# Altium footprint library Miscellaneous Base.PcbLib: 153 footprints (part 2 of 10)
Each footprint in its own frame and in the unit in brackets; x right, y up, seen from the top. Pads: shape width x height; smd on the part's side, far side on the other; paste and mask are expansions set on the pad; w line width, h text height; cw(c..) or ccw(c..) is an arc to the next point about the centre after c.
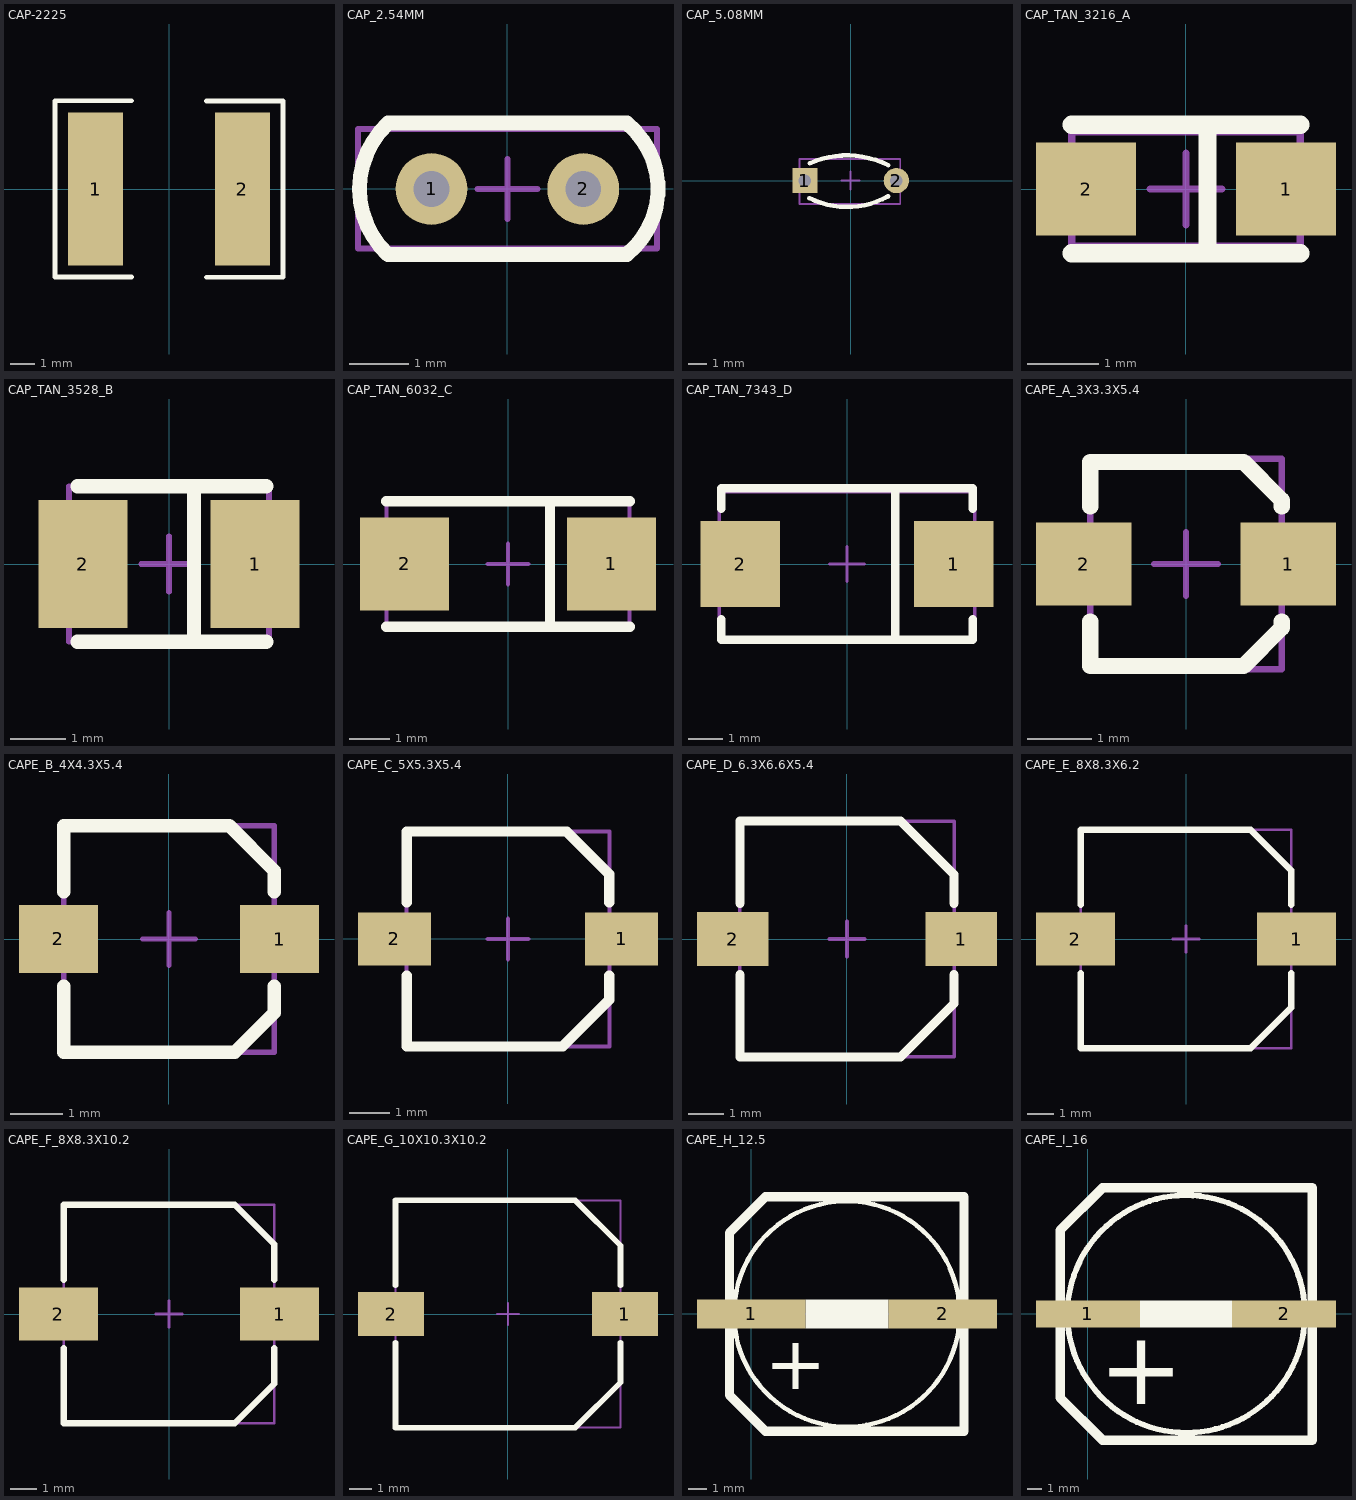
[diagram p1: the footprints below, top view; thin cyan lines are the x and y axes]

## CAP-2225 [mil]
pads (2):
  rect 90x250 smd: 1(-120,0) 2(120,0)
Top Overlay:
  lines w7.87: -61,-143.99 -186,-143.99 -186,144.01 -61,144.01 ; 61,-144 186,-144 186,144 61,144
3D body "2225C.STEP": height 70.87, standoff 0, extent -112.2,-124.99 112.21,125.01

## CAP_2.54MM [mm]
pads (2):
  round 1.2 hole 0.6: 1(-1.27,0) 2(1.27,0)
Top Overlay:
  lines w0.25: -2,1.097 ccw(c-0.972,-0.002) -2,-1.1 2,-1.1 ; -2,1.1 2,1.1 ; 1.999,-1.099 ccw(c1.1,0) 1.999,1.099
Mechanical 15:
  lines w0.1: -0.5,0 0.5,0 ; 0,-0.5 0,0.5 ; -2.5,-1 2.5,-1 2.5,1 -2.5,1 -2.5,-1
3D body "CAP TR2.54.STEP": height 5.92, standoff -2, extent -2.919,-0.836 2.919,0.86

## CAP_5.08MM [mm]
pads (2):
  rect 1.4x1.4 hole 0.7: 1(-2.54,0)
  round 1.4 hole 0.7: 2(2.54,0)
Top Overlay:
  lines w0.254: -2.286,-0.972 ccw(c-0.2,3.2) 2.082,-0.868 ; -2.28,0.955 cw(c-0.2,-3.7) 2.08,0.861
Mechanical 15:
  lines w0.1: -0.5,0 0.5,0 ; 0,-0.5 0,0.5 ; -2.84,-1.3 -2.84,1.2 2.76,1.2 2.76,-1.3 -2.84,-1.3
3D body "CAP ceramic F=5mm.STEP": height 6, standoff -3, extent -2.84,-1.3 2.76,1.2

## CAP_TAN_3216_A [mm]
pads (2):
  rect 1.4x1.3 smd: 1(1.4,0) 2(-1.4,0)
Top Overlay:
  lines w0.254: -1.6,-0.9 1.6,-0.9 ; -1.6,0.9 1.6,0.9 ; 0.3,-0.9 0.3,0.9
Mechanical 15:
  lines w0.1: -0.5,0 0.5,0 ; 0,-0.5 0,0.5 ; -1.6,-0.8 -1.6,0.8 1.6,0.8 1.6,-0.8 -1.6,-0.8
3D body "CAP-A.STEP": height 1.6, standoff 0, extent -1.6,-0.8 1.6,0.8

## CAP_TAN_3528_B [mm]
pads (2):
  rect 1.6x2.3 smd: 1(1.55,0) 2(-1.55,0)
Top Overlay:
  lines w0.254: -1.65,-1.4 1.75,-1.4 ; -1.65,1.4 1.75,1.4 ; 0.45,-1.4 0.45,1.4
Mechanical 15:
  lines w0.1: -0.5,0 0.5,0 ; 0,-0.5 0,0.5 ; -1.8,-1.4 1.8,-1.4 1.8,1.4 -1.8,1.4 -1.8,-1.4
3D body "CAP-B.STEP": height 1.9, standoff 0, extent -1.75,-1.4 1.75,1.4

## CAP_TAN_6032_C [mm]
pads (2):
  rect 2.2x2.3 smd: 1(2.55,0) 2(-2.55,0)
Top Overlay:
  lines w0.254: -3,-1.55 3,-1.55 ; -3,1.55 3,1.55 ; 1.036,-1.55 1.036,1.55
Mechanical 15:
  lines w0.1: -0.5,0 0.5,0 ; 0,-0.5 0,0.5 ; -3,-1.6 -3,1.6 3,1.6 3,-1.6 -3,-1.6
3D body "CAP-C.STEP": height 2.5, standoff 0, extent -3,-1.6 3,1.6

## CAP_TAN_7343_D [mm]
pads (2):
  rect 2.3x2.5 smd: 1(3.1,0) 2(-3.1,0)
Top Overlay:
  lines w0.254: -3.65,-1.6 -3.65,-2.2 3.65,-2.2 3.65,-1.6 ; -3.65,1.6 -3.65,2.2 3.65,2.2 3.65,1.6 ; 1.4,-2.2 1.4,2.2
Mechanical 15:
  lines w0.1: -0.5,0 0.5,0 ; 0,-0.5 0,0.5 ; -3.7,-2.2 -3.7,2.1 3.7,2.1 3.7,-2.2 -3.7,-2.2
3D body "CAP-D.STEP": height 2.8, standoff 0, extent -3.65,-2.2 3.65,2.1

## CAPE_A_3X3.3X5.4 [mm]
pads (2):
  rect 1.5x1.3 smd: 1(1.6,0) 2(-1.6,0)
Top Overlay:
  lines w0.254: -1.5,-0.9 -1.5,-1.6 0.9,-1.6 1.5,-1 1.5,-0.9 ; -1.5,0.9 -1.5,1.6 0.9,1.6 1.5,1 1.5,0.9
Mechanical 15:
  lines w0.1: -0.5,0 0.5,0 ; 0,-0.5 0,0.5 ; -1.5,-1.65 1.5,-1.65 1.5,1.65 -1.5,1.65 -1.5,-1.65
3D body "CAPE-A.STEP": height 5.4, standoff 0, extent -1.8,-1.65 1.8,1.65

## CAPE_B_4X4.3X5.4 [mm]
pads (2):
  rect 1.5x1.3 smd: 1(2.1,0) 2(-2.1,0)
Top Overlay:
  lines w0.254: -2,-0.9 -2,-2.15 1.25,-2.15 2,-1.4 2,-0.9 ; -2,0.9 -2,2.15 1.15,2.15 2,1.3 2,0.9
Mechanical 15:
  lines w0.1: -0.5,0 0.5,0 ; 0,-0.5 0,0.5 ; 2,-2.15 -2,-2.15 -2,2.15 2,2.15 2,-2.115
3D body "CAPE-B.STEP": height 5.4, standoff 0, extent -2.3,-2.175 2.3,2.125

## CAPE_C_5X5.3X5.4 [mm]
pads (2):
  rect 1.8x1.3 smd: 1(2.8,0) 2(-2.8,0)
Top Overlay:
  lines w0.254: -2.5,-0.9 -2.5,-2.65 1.35,-2.65 2.5,-1.5 2.5,-0.9 ; -2.5,0.9 -2.5,2.65 1.45,2.65 2.5,1.6 2.5,0.9
Mechanical 15:
  lines w0.1: -0.5,0 0.5,0 ; 0,-0.5 0,0.5 ; -2.5,-2.65 -2.5,2.65 2.5,2.65 2.5,-2.65 -2.5,-2.65
3D body "CAPE-C.STEP": height 5.41, standoff 0, extent -2.95,-2.6 2.95,2.7

## CAPE_D_6.3X6.6X5.4 [mm]
pads (2):
  rect 2x1.5 smd: 1(3.2,0) 2(-3.2,0)
Top Overlay:
  lines w0.254: -3,-1 -3,-3.3 1.5,-3.3 3,-1.8 3,-1 ; -3,1 -3,3.3 1.5,3.3 3,1.8 3,1
Mechanical 15:
  lines w0.1: -0.5,0 0.5,0 ; 0,-0.5 0,0.5 ; -3,-3.3 -3,3.3 3,3.3 3,-3.3 -3,-3.3
3D body "CAPE-D.STEP": height 5.4, standoff 0, extent -3.5,-3.3 3.5,3.3

## CAPE_E_8X8.3X6.2 [mm]
pads (2):
  rect 3x2 smd: 1(4.2,0) 2(-4.2,0)
Top Overlay:
  lines w0.254: -4,-1.3 -4,-4.15 2.45,-4.15 4,-2.6 4,-1.3 ; -4,1.3 -4,4.15 2.45,4.15 4,2.6 4,1.3
Mechanical 15:
  lines w0.1: -0.5,0 0.5,0 ; 0,-0.5 0,0.5 ; -4,-4.15 -4,4.15 4,4.15 4,-4.15 -4,-4.15
3D body "CAPE-E.STEP": height 6.2, standoff 0, extent -4.5,-4.15 4.5,4.15

## CAPE_F_8X8.3X10.2 [mm]
pads (2):
  rect 3x2 smd: 1(4.2,0) 2(-4.2,0)
Top Overlay:
  lines w0.254: -4,-1.3 -4,-4.15 2.5,-4.15 4,-2.65 4,-1.3 ; -4,1.3 -4,4.15 2.5,4.15 4,2.65 4,1.3
Mechanical 15:
  lines w0.1: -0.5,0 0.5,0 ; 0,-0.5 0,0.5 ; -4,-4.15 -4,4.15 4,4.15 4,-4.15 -4,-4.15
3D body "CAPE-F.STEP": height 10.2, standoff 0, extent -4.95,-4.15 4.95,4.15

## CAPE_G_10X10.3X10.2 [mm]
pads (2):
  rect 3x2 smd: 1(5.3,0) 2(-5.3,0)
Top Overlay:
  lines w0.254: -5.1,-1.3 -5.1,-5.15 3.05,-5.15 5.1,-3.1 5.1,-1.3 ; -5.1,1.3 -5.1,5.15 3.05,5.15 5.1,3.1 5.1,1.3
Mechanical 15:
  lines w0.1: -0.5,0 0.5,0 ; 0,-0.5 0,0.5 ; -5.1,-5.15 -5.1,5.15 5.1,5.15 5.1,-5.15 -5.1,-5.15
3D body "CAPE-G.STEP": height 10.2, standoff 0, extent -5.8,-5.15 5.8,5.15

## CAPE_H_12.5 [mm]
pads (2):
  rect 6x1.6 smd: 1(0,0) 2(10.625,0)
Top Overlay:
  circle w0.254: c5.303,0 r6.25
  rectangle: 3.019,-0.8 7.601,0.8
  lines w0.508: -1.202,-4.498 -1.202,4.494 0.797,6.493 0.799,6.495 11.797,6.495 11.797,-6.499 0.799,-6.499 -1.202,-4.498
  text "+" at 0.75,-4.168 h3

## CAPE_I_16 [mm]
pads (2):
  rect 7x1.8 smd: 1(0,0) 2(13.215,0)
Top Overlay:
  rectangle: 3.503,-0.9 9.696,0.914
  lines w0.381: 14.301,2.24 ccw(c6.62,0.001) 14.315,2.19
  lines w0.635: 15.122,-8.499 15.123,-8.5 ; 15.122,8.496 15.123,8.497 ; 15.123,-8.5 15.123,8.497 ; 15.123,-8.5 0.981,-8.5 -1.877,-5.642 -1.877,5.638 0.981,8.497 15.123,8.497
  text "+" at 0.729,-6.087 h5